# Altium footprint library AI.PcbLib: 137 footprints (part 3 of 9)
Each footprint in its own frame and in the unit in brackets; x right, y up, seen from the top. Pads: shape width x height; smd on the part's side, far side on the other; paste and mask are expansions set on the pad; w line width, h text height; cw(c..) or ccw(c..) is an arc to the next point about the centre after c.
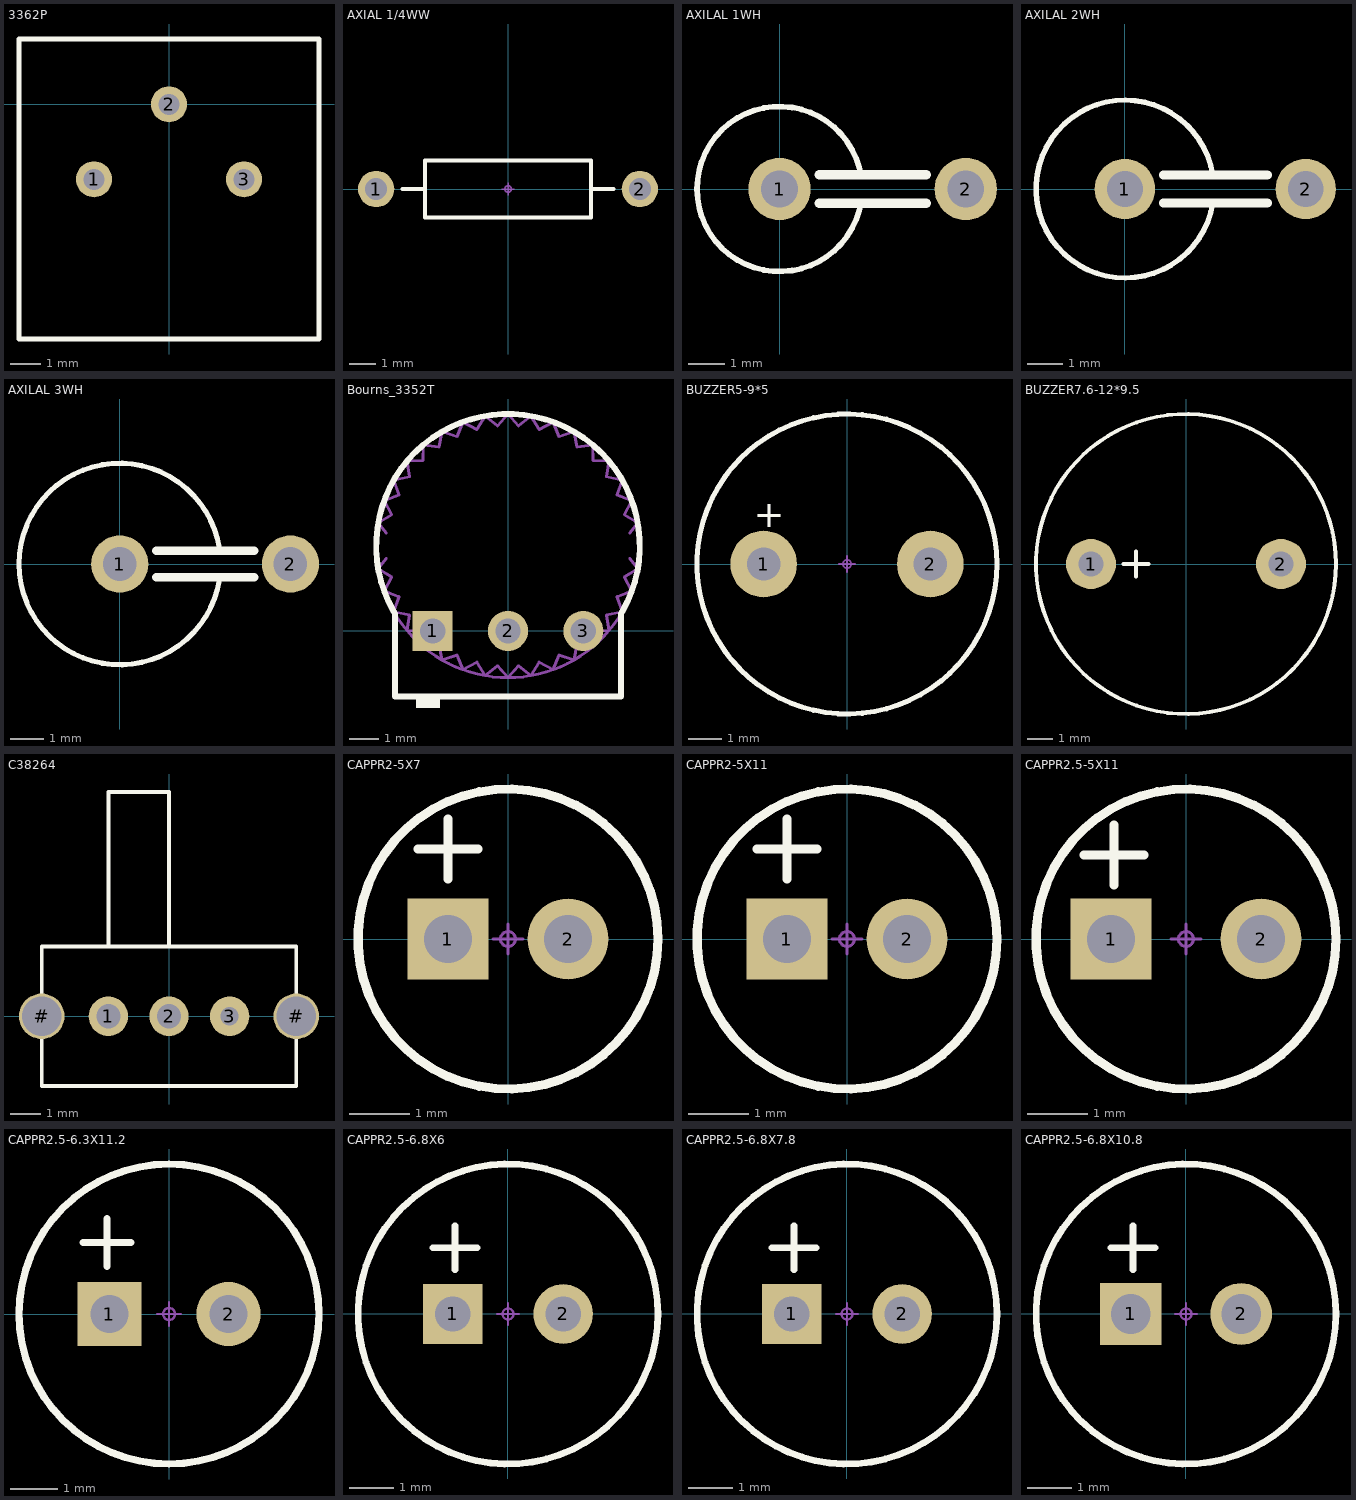
[diagram p2: the footprints below, top view; thin cyan lines are the x and y axes]

## 3362P [mm]
pads (3):
  round 1.2 hole 0.7: 1(-2.5,-2.5) 2(0,0) 3(2.5,-2.5)
Top Overlay:
  lines w0.152: -5,-7.825 5,-7.825 5,2.175 -5,2.175 -5,-7.825
Mechanical 15:
  circle w0.05: c0,0 r0.125
  lines w0.05: -0.25,0 0.25,0 ; 0,-0.25 0,0.25
3D body "dianweiqi2.stp": height 10.25, standoff -6, extent -4.8,-7.5 4.8,2.1

## AXIAL 1/4WW [mm]
pads (2):
  round 1.4 hole 0.85: 1(-5.08,0)
  round 1.4 hole 0.85 mask+0.07: 2(5.08,0)
Top Overlay:
  lines w0.152: -4.064,0 -3.2,0 ; 3.2,0 4.064,0 ; -3.2,-1.1 3.2,-1.1 3.2,1.1 -3.2,1.1 -3.2,-1.1
Mechanical 15:
  circle w0.05: c0,0 r0.125
  lines w0.05: -0.25,0 0.25,0 ; 0,-0.25 0,0.25
3D body "res_1_4w.stp": height 2.5, standoff -2.5, extent -5.35,-1.25 5.35,1.25

## AXILAL 1WH [mm]
pads (2):
  round 1.7 hole 1: 1(0,0) 2(5.08,0)
Top Overlay:
  lines w0.152: 2.225,-0.338 cw(c0,0) 2.225,0.338
  lines w0.254: 1.082,-0.39 3.998,-0.39 ; 1.082,0.39 3.998,0.39
Mechanical 15:
  circle w0.05: c0,0 r0.125
  lines w0.05: -0.25,0 0.25,0 ; 0,-0.25 0,0.25
3D body "RESADV508-1670X520.stp": height 23.6, standoff -3.7, extent -2.6,-2.6 5.47,2.6

## AXILAL 2WH [mm]
pads (2):
  round 1.7 hole 1: 1(0,0) 2(5.08,0)
Top Overlay:
  lines w0.152: 2.472,-0.375 cw(c0,0) 2.472,0.375
  lines w0.254: 1.082,-0.39 3.998,-0.39 ; 1.082,0.39 3.998,0.39
Mechanical 15:
  circle w0.05: c0,0 r0.125
  lines w0.05: -0.25,0 0.25,0 ; 0,-0.25 0,0.25
3D body "RESADV508-1670X520.stp": height 23.6, standoff -3.7, extent -2.6,-2.6 5.47,2.6

## AXILAL 3WH [mm]
pads (2):
  round 1.7 hole 1: 1(0,0) 2(5.08,0)
Top Overlay:
  lines w0.152: 2.966,-0.45 cw(c0,0) 2.966,0.45
  lines w0.254: 1.082,-0.39 3.998,-0.39 ; 1.082,0.39 3.998,0.39
Mechanical 15:
  circle w0.05: c0,0 r0.125
  lines w0.05: -0.25,0 0.25,0 ; 0,-0.25 0,0.25
3D body "RESADV508-1670X520.stp": height 23.6, standoff -3.7, extent -2.6,-2.6 5.47,2.6

## Bourns_3352T [mm] "TH, 3-Leads, Body 9.53x8.89mm, Pitch 2.54mm"
height 4.32
pads (3):
  rect 1.35x1.35 hole 0.85: 1(-2.54,0)
  round 1.35 hole 0.85: 2(0,0) 3(2.54,0)
Top Overlay:
  region: -2.3,-2.6 -2.3,-2.2 -3.1,-2.2 -3.1,-2.6
  lines w0.2: -3.849,0.647 cw(c0,2.87) 3.849,0.647 ; -3.81,0.58 -3.81,-2.21 3.81,-2.21 3.81,0.58
Mechanical 5:
  lines w0.1: -4.105,2.44 -4.377,2.098 ; -4.105,3.3 -4.377,3.642 ; -3.81,0.58 -3.81,-2.21 3.81,-2.21 3.81,0.58 ; 4.105,2.44 4.377,2.098 ; 4.105,3.3 4.377,3.642 ; -4.377,2.098 cw(c0,2.87) -4.377,3.642 ; -4.377,2.098 ccw(c0,2.87) -4.177,1.35 ; -4.377,2.098 -3.922,1.819 -4.177,1.35 ; -4.377,3.642 cw(c0,2.87) -4.177,4.39 ; -4.377,3.642 -3.922,3.921 -4.177,4.39 ; -4.177,1.35 ccw(c0,2.87) -3.849,0.647 ; -4.177,1.35 -3.68,1.154 -3.849,0.647 ; -4.177,4.39 cw(c0,2.87) -3.849,5.093 ; -4.177,4.39 -3.68,4.586 -3.849,5.092 ; -3.849,0.647 ccw(c0,2.87) -3.405,0.013 ; -3.849,0.647 -3.326,0.541 -3.405,0.013 ; -3.849,5.093 cw(c0,2.87) -3.405,5.727 ; -3.849,5.092 -3.326,5.199 -3.405,5.727 ; -3.405,0.013 ccw(c0,2.87) -2.857,-0.535 ; -3.405,0.013 -2.871,-0.001 -2.857,-0.535 ; -3.405,5.727 cw(c0,2.87) -2.857,6.275 ; -3.405,5.727 -2.871,5.741 -2.857,6.275 ; -2.857,-0.535 ccw(c0,2.87) -2.223,-0.979 ; -2.857,-0.535 -2.329,-0.456 -2.222,-0.979 ; -2.857,6.275 cw(c0,2.87) -2.223,6.719 ; -2.857,6.275 -2.329,6.196 -2.222,6.719 ; -2.223,-0.979 ccw(c0,2.87) -1.52,-1.307 ; -2.222,-0.979 -1.716,-0.81 -1.52,-1.307 ; -2.223,6.719 cw(c0,2.87) -1.52,7.047 ; -2.222,6.719 -1.716,6.55 -1.52,7.047 ; -1.52,-1.307 ccw(c0,2.87) -0.772,-1.507 ; -1.52,-1.307 -1.051,-1.052 -0.772,-1.507 ; -1.52,7.047 cw(c0,2.87) -0.772,7.247 ; -1.52,7.047 -1.051,6.792 -0.772,7.247 ; -0.772,-1.507 ccw(c0,2.87) 0,-1.575 ; -0.772,-1.507 -0.354,-1.175 0,-1.575 ; -0.772,7.247 cw(c0,2.87) 0,7.315 ; -0.772,7.247 -0.354,6.915 0,7.315 ; 0,-1.575 ccw(c0,2.87) 0.772,-1.507 ; 0,-1.575 0.354,-1.175 0.772,-1.507 ; 0,7.315 cw(c0,2.87) 0.772,7.247 ; 0,7.315 0.354,6.915 0.772,7.247 ; 0.772,-1.507 ccw(c0,2.87) 1.52,-1.307 ; 0.772,-1.507 1.051,-1.052 1.52,-1.307 ; 0.772,7.247 cw(c0,2.87) 1.52,7.047 ; 0.772,7.247 1.051,6.792 1.52,7.047 ; 1.52,-1.307 ccw(c0,2.87) 2.223,-0.979 ; 1.52,-1.307 1.716,-0.81 2.222,-0.979 ; 1.52,7.047 cw(c0,2.87) 2.223,6.719 ; 1.52,7.047 1.716,6.55 2.222,6.719 ; 2.223,-0.979 ccw(c0,2.87) 2.857,-0.535 ; 2.222,-0.979 2.329,-0.456 2.857,-0.535 ; 2.223,6.719 cw(c0,2.87) 2.857,6.275 ; 2.222,6.719 2.329,6.196 2.857,6.275 ; 2.857,-0.535 ccw(c0,2.87) 3.405,0.013 ; 2.857,-0.535 2.871,-0.001 3.405,0.013 ; 2.857,6.275 cw(c0,2.87) 3.405,5.727 ; 2.857,6.275 2.871,5.741 3.405,5.727 ; 3.405,0.013 ccw(c0,2.87) 3.849,0.647 ; 3.405,0.013 3.326,0.541 3.849,0.647 ; 3.405,5.727 cw(c0,2.87) 3.849,5.093 ; 3.405,5.727 3.326,5.199 3.849,5.092 ; 3.849,0.647 ccw(c0,2.87) 4.177,1.35 ; 3.849,0.647 3.68,1.154 4.177,1.35 ; 3.849,5.093 cw(c0,2.87) 4.177,4.39 ; 3.849,5.092 3.68,4.586 4.177,4.39 ; 4.177,1.35 ccw(c0,2.87) 4.377,2.098 ; 4.177,1.35 3.922,1.819 4.377,2.098 ; 4.177,4.39 cw(c0,2.87) 4.377,3.642 ; 4.177,4.39 3.922,3.921 4.377,3.642 ; 4.377,2.098 ccw(c0,2.87) 4.377,3.642
  text ".Designator" at -2,2 h1.02
3D body "3352T.stp": height 3.81, standoff -4.75, extent -4.445,-2.21 4.445,7.315

## BUZZER5-9*5 [mm]
pads (2):
  round 2 hole 1: 1(-2.5,0) 2(2.5,0)
Top Overlay:
  circle w0.152: c0,0 r4.5
  text "+" at -2.8,1.1 h0.81
Mechanical 15:
  circle w0.05: c0,0 r0.125
  lines w0.05: -0.25,0 0.25,0 ; 0,-0.25 0,0.25
3D body "fmq.stp": height 5.5, standoff -2, extent -4.625,-4.625 4.625,4.625

## BUZZER7.6-12*9.5 [mm]
pads (2):
  round 2 hole 1: 1(-3.8,0)
  round 2 hole 1.016: 2(3.8,0)
Top Overlay:
  circle w0.152: c0,0 r6
  lines w0.152: -2.506,0 -1.49,0 ; -1.998,-0.508 -1.998,0.508
3D body "BUZZER.stp": height 5.5, standoff -1.25, extent -5.525,-5.512 5.475,5.488

## C38264 [mm]
height 18.5
pads (5):
  round 1.3 hole 0.8: 1(-2,0) 2(0,0)
  round 1.3 hole 0.6: 3(2,0)
  round 1.5 hole 1.3: #(-4.2,0) #(4.2,0)
Top Overlay:
  lines w0.127: -2,2.3 -2,7.4 0,7.4 0,2.3 ; -4.2,-2.3 -4.2,2.3 4.2,2.3 4.2,-2.3 -4.2,-2.3
Mechanical 15:
  circle w0.05: c0,0 r0.125
  lines w0.05: -0.25,0 0.25,0 ; 0,-0.25 0,0.25
3D body "sw-1p2t-2_0.stp": height 4.8, standoff -2.5, extent -4.3,-2.25 4.3,7.95

## CAPPR2-5X7 [mm]
pads (2):
  rect 1.35x1.35 hole 0.8: 1(-1,0)
  round 1.35 hole 0.8: 2(1,0)
Top Overlay:
  circle w0.152: c0,0 r2.5
  lines w0.152: -1.5,1.5 -0.5,1.5 ; -1,1 -1,2
Mechanical 15:
  circle w0.05: c0,0 r0.125
  lines w0.05: -0.25,0 0.25,0 ; 0,-0.25 0,0.25
3D body "CAPPR200-500X700.stp": height 7, standoff -3.6, extent -2.512,-2.512 2.488,2.488

## CAPPR2-5X11 [mm]
pads (2):
  rect 1.35x1.35 hole 0.8: 1(-1,0)
  round 1.35 hole 0.8: 2(1,0)
Top Overlay:
  circle w0.152: c0,0 r2.5
  lines w0.152: -1.5,1.5 -0.5,1.5 ; -1,1 -1,2
Mechanical 15:
  circle w0.05: c0,0 r0.125
  lines w0.05: -0.25,0 0.25,0 ; 0,-0.25 0,0.25
3D body "CAPPR200-500X1100.stp": height 10.9, standoff -3.6, extent -2.512,-2.512 2.488,2.488

## CAPPR2.5-5X11 [mm]
pads (2):
  rect 1.35x1.35 hole 0.8: 1(-1.25,0)
  round 1.35 hole 0.8: 2(1.25,0)
Top Overlay:
  circle w0.152: c0,0 r2.5
  lines w0.152: -1.7,1.4 -0.7,1.4 ; -1.2,0.9 -1.2,1.9
Mechanical 15:
  circle w0.05: c0,0 r0.125
  lines w0.05: -0.25,0 0.25,0 ; 0,-0.25 0,0.25
3D body "CAPPR250-500X1100.stp": height 10.9, standoff -3.6, extent -2.512,-2.512 2.488,2.488

## CAPPR2.5-6.3X11.2 [mm]
pads (2):
  rect 1.35x1.35 hole 0.8: 1(-1.25,0)
  round 1.35 hole 0.8: 2(1.25,0)
Top Overlay:
  circle w0.152: c0,0 r3.15
  lines w0.152: -1.8,1.5 -0.8,1.5 ; -1.3,1 -1.3,2
Mechanical 15:
  circle w0.05: c0,0 r0.125
  lines w0.05: -0.25,0 0.25,0 ; 0,-0.25 0,0.25
3D body "CAPPR250-630X1120.stp": height 11.2, standoff -3.6, extent -3.159,-3.176 3.141,3.124

## CAPPR2.5-6.8X6 [mm]
pads (2):
  rect 1.35x1.35 hole 0.8: 1(-1.25,0)
  round 1.35 hole 0.8: 2(1.25,0)
Top Overlay:
  circle w0.152: c0,0 r3.4
  lines w0.152: -1.7,1.5 -0.7,1.5 ; -1.2,1 -1.2,2
Mechanical 15:
  circle w0.05: c0,0 r0.125
  lines w0.05: -0.25,0 0.25,0 ; 0,-0.25 0,0.25
3D body "CAPPR250-680X600.stp": height 6, standoff -3.6, extent -3.41,-3.41 3.39,3.39

## CAPPR2.5-6.8X7.8 [mm]
pads (2):
  rect 1.35x1.35 hole 0.8: 1(-1.25,0)
  round 1.35 hole 0.8: 2(1.25,0)
Top Overlay:
  circle w0.152: c0,0 r3.4
  lines w0.152: -1.7,1.5 -0.7,1.5 ; -1.2,1 -1.2,2
Mechanical 15:
  circle w0.05: c0,0 r0.125
  lines w0.05: -0.25,0 0.25,0 ; 0,-0.25 0,0.25
3D body "CAPPR250-680X780.stp": height 7.8, standoff -3.6, extent -3.41,-3.41 3.39,3.39

## CAPPR2.5-6.8X10.8 [mm]
pads (2):
  rect 1.4x1.4 hole 0.9: 1(-1.25,0)
  round 1.4 hole 0.9: 2(1.25,0)
Top Overlay:
  circle w0.152: c0,0 r3.4
  lines w0.152: -1.7,1.5 -0.7,1.5 ; -1.2,1 -1.2,2
Mechanical 15:
  circle w0.05: c0,0 r0.125
  lines w0.05: -0.25,0 0.25,0 ; 0,-0.25 0,0.25
3D body "CAPPR250-680X1080.stp": height 10.8, standoff -3.6, extent -3.41,-3.41 3.39,3.39